# Altium schematic symbol library BARKO_SCHLIB.SchLib: 1064 symbols (part 9 of 11) (continued)
## R-1R-1206_1 (continued)
RES SMD 1 OHM 1% 1/2W 1206; Manufacturer: Stackpole Electronics; Manufacturer Part Number: RNCP1206FTD1R00; Temperature Coefficient: 100ppm/°C; Power Rating: 333mW; .PCBCHK: USED; .Creator: F:TALI; Washability: OK; Stock 1: 171918; Pricing 1: 1=0.1, 10=0.093, 100=0.0358, 1000=0.01575, 2500=0.0136 (USD); Mount: Surface Mount; Case/Package: 1206; Case Code (Metric): 3216; Min Operating Temperature: -55°C; Max Operating Temperature: 155°C; Resistance: 1R; Tolerance: 1%; Packaging: Tape and Reel; Composition: Thin Film; Number of Terminations: 2; Features: Anti-Sulfur,Moisture Resistant; Length: 0.122inch; Height: 0.024inch; Width: 0.059inch; Lead Free: Lead Free; Package Quantity: 1; ComponentLink1URL: http://www1.futureelectronics.com/doc/ROHM%20SEMICONDUCTOR/ESR10EZPD.pdf; ComponentLink1Description: http://www1.futureelectronics.com/doc/ROHM%20SEMICONDUCTOR/ESR10EZPD.pdf; ComponentLink2URL: http://www.rohm.com/web/global/datasheet/ESR01MZPF/esr-e; ComponentLink2Description: http://www.rohm.com/web/global/datasheet/ESR01MZPF/esr-e; ComponentLink3URL: https://www.rohm.com/datasheet/ESR01MZPF/esr-e; ComponentLink3Description: https://www.rohm.com/datasheet/ESR01MZPF/esr-e; Stock 2: 9791; Pricing 2: 1=0.16, 10=0.133, 100=0.052, 1000=0.02178, 2500=0.01996 (USD); .SCHCHK: USED; Supplier 1: Digi-Key; Supplier Part Number 1: RNCP1206FTD1R00DKR-ND
footprint R-1206
pins: 1, 2

## R-2K2-0402
designator R?, comment 2K2  Case/Package: 0402
RES 2.2K OHM 5% 1/16W 0402; Manufacturer: Stackpole Electronics; Manufacturer Part Number: RMCF0402JT2K20; Resistance: 2.2kR; Power Rating: 63mW; Temperature Coefficient: 100ppm/°C; Working Voltage: 50V; .Creator: F:TALI; .PCBCHK: USED; Washability: OK; Supplier 1: Digi-Key; Supplier Part Number 1: RMCF0402JT2K20DKR-ND; Stock 1: 360431; Pricing 1: 1=0.1, 10=0.012, 100=0.005, 1000=0.00224, 2500=0.00195, 5000=0.00161 (USD); Mount: Surface Mount; Case Code (Metric): 1005; Contact Plating: Matte,Tin; Min Operating Temperature: -55°C; Max Operating Temperature: 155°C; Packaging: Tape and Reel; Tolerance: 5%; Composition: Thick Film; Number of Terminations: 2; Max Power Dissipation: 63mW; Features: Automotive AEC-Q200; Length: 0.039inch; Height: 0.016inch; Width: 0.02inch; Radiation Hardening: No; Lead Free: Lead Free; ComponentLink1URL: http://www.seielect.com/Catalog/SEI-RMCF_RMCP.pdf?src-supplier=Future+Electronics; ComponentLink1Description: http://www.seielect.com/Catalog/SEI-RMCF_RMCP.pdf?src-supplier=Future+Electronics; Case Code (Imperial): 0402; .SCHCHK: USED
footprint R-0402
pins: 1, 2

## R-2K2-0402-1
designator R?, comment 2K2  Case/Package: 0402
RES SMD 2.2K OHM 1% 1/16W 0402; Manufacturer: Yageo; Manufacturer Part Number: RC0402FR-072K2L; Resistance: 2.2kR; Power Rating: 63mW; Voltage Rating: 50V; Temperature Coefficient: 100ppm/°C; .Creator: F:TALI; .PCBCHK: USED; Washability: OK; Supplier 1: Digi-Key; Stock 1: 14832343; Pricing 1: 1 = 0.10000, 10 = 0.01600, 100 = 0.00670, 1000 = 0.00301, 2500 = 0.00261, 5000 = 0.00215 (USD); RoHS: Yes; Weight: 2.3E-05oz; Case Code (Imperial): 0402; Case Code (Metric): 1005; Min Operating Temperature: -55°C; Max Operating Temperature: 155°C; Packaging: Tape and Reel; Tolerance: 1%; Composition: Thick Film; Military Standard: Not; Termination: SMD/SMT; Length: 1mm; Height: 0.35mm; Width: 0.5mm; Depth: 0.5mm; Lead Free: Lead Free; REACH SVHC: Unknown; ComponentLink1URL: http://documents.rs-components.com/techlib://itc_doclist_GB.htm?stockno=6186532&src-supplier=RSComponents; ComponentLink1Description: http://documents.rs-components.com/techlib://itc_doclist_GB.htm?stockno=6186532&src-supplier=RSComponents; ComponentLink2URL: http://www.yageo.com/documents/recent/PYu-RC_Group_51_RoHS_L_9.pdf?src-supplier=Mouser; ComponentLink2Description: http://www.yageo.com/documents/recent/PYu-RC_Group_51_RoHS_L_9.pdf?src-supplier=Mouser; ComponentLink3URL: http://www.yageo.com/documents/recent/PYu-RC0402_51_RoHS_L_6_r.pdf?src-supplier=Future+Electronics; ComponentLink3Description: http://www.yageo.com/documents/recent/PYu-RC0402_51_RoHS_L_6_r.pdf?src-supplier=Future+Electronics; ComponentLink4URL: http://www.farnell.com/datasheets/1018594.pdf?src-supplier=Element14; ComponentLink4Description: http://www.farnell.com/datasheets/1018594.pdf?src-supplier=Element14; ComponentLink5URL: http://www.farnell.com/datasheets/2167052.pdf?src-supplier=Element14; ComponentLink5Description: http://www.farnell.com/datasheets/2167052.pdf?src-supplier=Element14; Supplier Part Number 1: 311-2.20KLRCT-ND; .SCHCHK: USED
footprint R-0402
pins: 1, 2

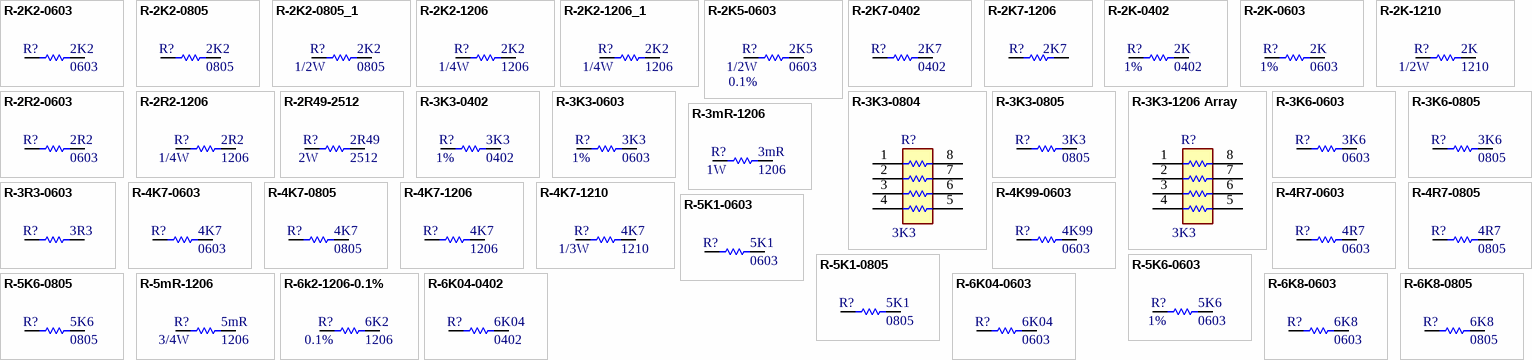
[diagram p36: symbols R-2K2-0603 to R-6K8-0805]

## R-2K2-0603
designator R?, comment 2K2  Case/Package: 0603
RES SMD 2.2K OHM 5% 1/10W 0603; Manufacturer: Yageo; Manufacturer Part Number: RC0603JR-072K2P; Resistance: 2.2kR; Max Power Dissipation: 100mW; Temperature Coefficient: 150ppm/°C; Voltage Rating (DC): 50V; .PCBCHK: USED; .Creator: F:TALI; Washability: OK; Stock 1: 2807; Pricing 1: 1=0.1, 10=0.044, 100=0.0178, 1000=0.00798, 2500=0.00693 (USD); Case Code (Metric): 1608; Case Code (Imperial): 0603; Min Operating Temperature: -55°C; Max Operating Temperature: 155°C; Packaging: Tape and Reel; Composition: Thick Film; Number of Terminations: 2; Tolerance: 5%; Features: Moisture Resistant; Length: 0.063inch; Height: 0.022inch; Width: 0.031inch; Stock 2: 2314804; Pricing 2: 1=0.1, 10=0.022, 100=0.0088, 1000=0.00396, 2500=0.00344 (USD); Number of Pins: 2; Power Rating: 100mW; Voltage Rating: 50V; Termination: SMD/SMT; Military Standard: Not; Depth: 0.8mm; REACH SVHC: Unknown; Lead Free: Lead Free; Stock 3: 4100; Pricing 3: 1=0.39, 10=0.332, 100=0.1298, 1000=0.05435, 2500=0.04982 (USD); Mount: Surface Mount; Contact Plating: Lead,Tin; Stock 4: 4265000; Pricing 4: 5000=0.00312, 10000=0.00271, 25000=0.00238, 50000=0.00219, 125000=0.00214 (USD); Package Quantity: 1; ComponentLink1URL: http://www.farnell.com/datasheets/1868787.pdf; ComponentLink1Description: http://www.farnell.com/datasheets/1868787.pdf; ComponentLink2URL: http://www.farnell.com/datasheets/2167052.pdf; ComponentLink2Description: http://www.farnell.com/datasheets/2167052.pdf; ComponentLink3URL: http://www.yageo.com/documents/recent/PYu-RC_Group_51_RoHS_L_9.pdf; ComponentLink3Description: http://www.yageo.com/documents/recent/PYu-RC_Group_51_RoHS_L_9.pdf; ComponentLink4URL: http://www.farnell.com/datasheets/443971.pdf; ComponentLink4Description: http://www.farnell.com/datasheets/443971.pdf; .SCHCHK: USED; Supplier 1: Digi-Key; Supplier Part Number 1: YAG1313DKR-ND
footprint R-0603
pins: 1, 2

## R-2K2-0805
designator R?, comment 2K2  Case Code (Imperial): 0805
RES SMD 2.2K OHM 5% 1/8W 0805; Manufacturer: Stackpole Electronics; Manufacturer Part Number: RMCF0805JT2K20; Resistance: 2.2kR; Power Rating: 125mW; Temperature Coefficient: 100ppm/°C; Voltage Rating (DC): 150V; .PCBCHK: USED; .Creator: F:TALI; Washability: OK; Stock 1: 352492; Pricing 1: 1=0.1, 10=0.021, 100=0.0086, 1000=0.00385, 2500=0.00334 (USD); Mount: Surface Mount; Case/Package: 0805; Case Code (Metric): 2012; Contact Plating: Matte,Tin; Min Operating Temperature: -55°C; Max Operating Temperature: 155°C; Tolerance: 5%; Packaging: Tape and Reel; Composition: Thick Film; Number of Terminations: 2; Military Standard: Not; Max Power Dissipation: 125mW; Features: Automotive AEC-Q200; Length: 2mm; Height: 0.026inch; Width: 0.049inch; Depth: 1.25mm; Radiation Hardening: No; Lead Free: Lead Free; ComponentLink1URL: https://www.verical.com/server-webapp/html/getDatasheet?partID=366464; ComponentLink1Description: https://www.verical.com/server-webapp/html/getDatasheet?partID=366464; Stock 2: 5318281; Pricing 2: 1=0.1, 10=0.046, 100=0.0186, 1000=0.00835, 2500=0.00725 (USD); Number of Pins: 2; Package Quantity: 1; Voltage Rating: 150V; Termination: SMD/SMT; Lead Pitch: 0.4mm; REACH SVHC: Unknown; ComponentLink2URL: http://www.farnell.com/datasheets/38627.pdf; ComponentLink2Description: http://www.farnell.com/datasheets/38627.pdf; ComponentLink3URL: http://www.farnell.com/datasheets/444164.pdf; ComponentLink3Description: http://www.farnell.com/datasheets/444164.pdf; ComponentLink4URL: http://www.yageo.com/documents/recent/PYu-RC_Group_51_RoHS_L_9.pdf; ComponentLink4Description: http://www.yageo.com/documents/recent/PYu-RC_Group_51_RoHS_L_9.pdf; Stock 3: 12445; Pricing 3: 1=0.1, 10=0.068, 100=0.0278, 1000=0.01251, 2500=0.01085 (USD); Thickness: 508um; ComponentLink5URL: http://www.bourns.com/data/global/pdfs/CHPREZTR.pdf; ComponentLink5Description: http://www.bourns.com/data/global/pdfs/CHPREZTR.pdf; ComponentLink6URL: http://www.bourns.com/docs/Product-Datasheets/CHPREZTR.pdf; ComponentLink6Description: http://www.bourns.com/docs/Product-Datasheets/CHPREZTR.pdf; ComponentLink7URL: https://www.bourns.com/docs/Product-Datasheets/CHPREZTR.pdf; ComponentLink7Description: https://www.bourns.com/docs/Product-Datasheets/CHPREZTR.pdf; .SCHCHK: USED; Supplier 1: Digi-Key; Supplier Part Number 1: RMCF0805JT2K20DKR-ND
footprint R-0805
pins: 1, 2

## R-2K2-0805_1
designator R?, comment 2K2  Power Rating: 1/2W  Case Code (Imperial): 0805
RES SMD 2.2K OHM 5% 1/2W 0805; Manufacturer: Vishay Dale; Manufacturer Part Number: CRCW08052K20JNEAHP; Resistance: 2.2kR; Voltage Rating: 150V; Max Power Dissipation: 333mW; Temperature Coefficient: 200ppm/°C; .Creator: F:TALI; .PCBCHK: USED; Washability: OK; Supplier 1: Digi-Key; Stock 1: 18079; Pricing 1: 1=0.25, 10=0.213, 100=0.0832, 1000=0.03485, 2500=0.03194 (USD); Case/Package: 0805; Weight: 0.000194oz; Case Code (Metric): 2012; Contact Plating: Tin; Min Operating Temperature: -55°C; Max Operating Temperature: 155°C; Package Quantity: 1; Tolerance: 5%; Packaging: Tape and Reel; Composition: Thick Film; Number of Terminations: 2; Termination: SMD/SMT; Features: Automotive AEC-Q200; Length: 0.079inch; Height: 0.024inch; Width: 0.049inch; Radiation Hardening: No; Lead Free: Lead Free; ComponentLink1URL: http://www.vishay.com/docs/20043/crcwhpe3.pdf; ComponentLink1Description: http://www.vishay.com/docs/20043/crcwhpe3.pdf; ComponentLink2URL: http://www.mouser.com/ds/2/427/crcwhpe3-46056.pdf; ComponentLink2Description: http://www.mouser.com/ds/2/427/crcwhpe3-46056.pdf; Supplier Part Number 1: 541-2.2KTADKR-ND; .SCHCHK: USED
pins: 1, 2

## R-2K2-1206
designator R?, comment 2K2  Max Power Dissipation: 1/4W  Case Code (Imperial): 1206
RES SMD 2.2K OHM 5% 1/4W 1206; Manufacturer: Yageo; Manufacturer Part Number: RC1206JR-072K2L; Power Rating: 250mW; Resistance: 2.2kR; Voltage Rating: 200V; Temperature Coefficient: 100ppm/°C; .PCBCHK: USED; .Creator: F:TALI; Washability: OK; Stock 1: 16821; Pricing 1: 1=0.1, 10=0.07, 100=0.0284, 1000=0.01274, 2500=0.01106 (USD); Case/Package: 1206; Weight: 0.000571oz; Case Code (Metric): 3216; Min Operating Temperature: -55°C; Max Operating Temperature: 155°C; Composition: Thick Film; Tolerance: 5%; Packaging: Tape and Reel; Termination: SMD/SMT; Military Standard: Not; Length: 3.2mm; Height: 0.55mm; Width: 1.6mm; Depth: 1.6mm; REACH SVHC: Unknown; Lead Free: Lead Free; ComponentLink1URL: http://www.yageo.com.tw/exep/pages/download/literatures/PYu-R_INT-thick_7.pdf; ComponentLink1Description: http://www.yageo.com.tw/exep/pages/download/literatures/PYu-R_INT-thick_7.pdf; ComponentLink2URL: http://www.farnell.com/datasheets/444357.pdf; ComponentLink2Description: http://www.farnell.com/datasheets/444357.pdf; ComponentLink3URL: http://www.yageo.com/documents/recent/PYu-RC1206_51_RoHS_L-4.pdf; ComponentLink3Description: http://www.yageo.com/documents/recent/PYu-RC1206_51_RoHS_L-4.pdf; ComponentLink4URL: https://produktinfo.conrad.com/datenblaetter/400000-424999/402583-da-01-en-SMD_Widerstand_Chip1206_2_2_kOhm.pdf; ComponentLink4Description: https://produktinfo.conrad.com/datenblaetter/400000-424999/402583-da-01-en-SMD_Widerstand_Chip1206_2_2_kOhm.pdf; Stock 2: 332466; Pricing 2: 1=0.1, 10=0.074, 100=0.0301, 1000=0.01351, 2500=0.01172 (USD); Mount: Surface Mount; Contact Plating: Tin; Package Quantity: 1; Number of Terminations: 2; Voltage Rating (DC): 200V; Features: Automotive AEC-Q200; Radiation Hardening: No; ComponentLink5URL: http://industrial.panasonic.com/www-data/pdf/AOA0000/AOA0000CE1.pdf; ComponentLink5Description: http://industrial.panasonic.com/www-data/pdf/AOA0000/AOA0000CE1.pdf; ComponentLink6URL: http://www.farnell.com/datasheets/1500035.pdf; ComponentLink6Description: http://www.farnell.com/datasheets/1500035.pdf; ComponentLink7URL: https://www.alliedelec.com/m/d/51cd0790071e1666bdb9d00c57fcf960.pdf; ComponentLink7Description: https://www.alliedelec.com/m/d/51cd0790071e1666bdb9d00c57fcf960.pdf; ComponentLink8URL: http://www.farnell.com/datasheets/1678796.pdf; ComponentLink8Description: http://www.farnell.com/datasheets/1678796.pdf; ComponentLink9URL: http://www.farnell.com/datasheets/2059623.pdf; ComponentLink9Description: http://www.farnell.com/datasheets/2059623.pdf; Stock 3: 58559; Pricing 3: 1=0.1, 10=0.065, 100=0.0265, 1000=0.0119, 2500=0.01033 (USD); .SCHCHK: USED; Supplier 1: Digi-Key; Supplier Part Number 1: 311-2.2KERDKR-ND
footprint R-1206
pins: 1, 2

## R-2K2-1206_1
designator R?, comment 2K2  Max Power Dissipation: 1/4W  Case Code (Imperial): 1206
RES SMD 2K2 1/4W 5% 1206; Manufacturer: Bourns; Manufacturer Part Number: CR1206-FX-2201ELF; Resistance: 2.2kR; Tolerance: 1%; Temperature Coefficient: 100ppm/°C; Voltage Rating (DC): 200V; Power Rating: 250mW; .PCBCHK: USED; .Creator: F:TALI; Washability: OK; Number of Circuits: 1; Slew Rate: 2V/µs; -3db Bandwidth: 400kHz; Input Bias Current: 90uA; Input Offset Voltage (Vos): 5uV; Operating Supply Current: 1.8mA; Stock 1: 20978; Pricing 1: 1=0.1, 10=0.042, 100=0.0171, 1000=0.0077, 2500=0.00668 (USD); Mount: Surface Mount; Case/Package: 1206; Number of Pins: 2; Case Code (Metric): 3216; Contact Plating: Tin; Min Operating Temperature: -55°C; Max Operating Temperature: 155°C; Packaging: Tape and Reel; Composition: Thick Film; Number of Terminations: 2; Package Quantity: 5000; Military Standard: Not; Voltage Rating: 200V; Termination: SMD/SMT; Length: 3.2mm; Height: 0.6mm; Width: 1.6mm; Depth: 1.6mm; Thickness: 610um; Radiation Hardening: No; REACH SVHC: No SVHC; ComponentLink1URL: http://www.farnell.com/datasheets/2016309.pdf; ComponentLink1Description: http://www.farnell.com/datasheets/2016309.pdf; ComponentLink2URL: http://uk.rs-online.com/webdocs/0fcd/0900766b80fcdb72.pdf; ComponentLink2Description: http://uk.rs-online.com/webdocs/0fcd/0900766b80fcdb72.pdf; ComponentLink3URL: http://www.bourns.com/pdfs/chpreztr.pdf; ComponentLink3Description: http://www.bourns.com/pdfs/chpreztr.pdf; ComponentLink4URL: https://www.alliedelec.com/m/d/8318635a9e5af6f7dacb272be3e73d2e.pdf; ComponentLink4Description: https://www.alliedelec.com/m/d/8318635a9e5af6f7dacb272be3e73d2e.pdf; Weight: 0.000353oz; Features: Automotive AEC-Q200; Lead Free: Lead Free; ComponentLink5URL: https://www.distrelec.biz/Web/Downloads/a_/en/flD-CRCW-e3_data_en.pdf?mime=application%2Fpdf; ComponentLink5Description: https://www.distrelec.biz/Web/Downloads/a_/en/flD-CRCW-e3_data_en.pdf?mime=application%2Fpdf; ComponentLink6URL: http://www.vishay.com/docs/20035/dcrcwe3.pdf; ComponentLink6Description: http://www.vishay.com/docs/20035/dcrcwe3.pdf; ComponentLink7URL: http://www.farnell.com/datasheets/2046716.pdf; ComponentLink7Description: http://www.farnell.com/datasheets/2046716.pdf; ComponentLink8URL: https://www.alliedelec.com/m/d/0c934d6939ccefa68dbe0b96d821c8cf.pdf; ComponentLink8Description: https://www.alliedelec.com/m/d/0c934d6939ccefa68dbe0b96d821c8cf.pdf; ComponentLink9URL: http://www.vishay.com/docs/20008/dcrcw.pdf; ComponentLink9Description: http://www.vishay.com/docs/20008/dcrcw.pdf; ComponentLink10URL: https://www.verical.com/server-webapp/html/getDatasheet?partID=250918; ComponentLink10Description: https://www.verical.com/server-webapp/html/getDatasheet?partID=250918; ComponentLink11URL: http://uk.rs-online.com/webdocs/13ec/0900766b813ecc07.pdf; ComponentLink11Description: http://uk.rs-online.com/webdocs/13ec/0900766b813ecc07.pdf; Stock 2: 3711; Pricing 2: 1=0.17, 10=0.146, 100=0.0572, 1000=0.02396, 2500=0.02196 (USD); ComponentLink12URL: http://www.rohm.com/web/global/datasheet/ESR01MZPF/esr-e; ComponentLink12Description: http://www.rohm.com/web/global/datasheet/ESR01MZPF/esr-e; ComponentLink13URL: https://www.rohm.com/datasheet/ESR01MZPF/esr-e; ComponentLink13Description: https://www.rohm.com/datasheet/ESR01MZPF/esr-e; .SCHCHK: USED; Supplier 1: Digi-Key; Supplier Part Number 1: RHM2.2KICT-ND; Stock: 8804; Pricing: 1=2.78, 10=2.499, 25=2.3624, 100=1.9425, 250=1.743, 500=1.68, 1000=1.3965 (USD); RoHS: No; ComponentLink14URL: http://www.ti.com/general/docs/lit/getliterature.tsp?genericPartNumber=INA240&fileType=pdf&src-supplier=Farnell; ComponentLink14Description: http://www.ti.com/general/docs/lit/getliterature.tsp?genericPartNumber=INA240&fileType=pdf&src-supplier=Farnell; ComponentLink15URL: http://www.ti.com/lit/ds/symlink/ina240.pdf?src-supplier=Digi-Key; ComponentLink15Description: http://www.ti.com/lit/ds/symlink/ina240.pdf?src-supplier=Digi-Key
footprint R-1206
pins: 1, 2

## R-2K5-0603
designator R?, comment 2K5  Tolerance: 0.1%  Max Power Dissipation: 1/2W  Case Code (Imperial): 0603
RES SMD 2.5K OHM 0.1% 1/2W 0603; Manufacturer: Vishay Dale Thin Film; Manufacturer Part Number: PCAN0603E2501BST5; Resistance: 2.5kR; Temperature Coefficient: 25ppm/°C; .PCBCHK: USED; .Creator: F:TALI; Washability: OK; Supplier 1: Digi-Key; Supplier Part Number 1: 764-1254-6-ND; Stock 1: 8000; Pricing 1: 1=1.37, 10=1.217, 100=0.8836 (USD); Case/Package: 0603; Case Code (Metric): 1608; Min Operating Temperature: -55°C; Max Operating Temperature: 155°C; Packaging: Tape and Reel; Composition: Thin Film; Number of Terminations: 2; Features: Moisture Resistant; Length: 0.064inch; Height: 0.018inch; Width: 0.032inch; .SCHCHK: USED
footprint R-0603
pins: 1, 2

## R-2K7-0402
designator R?, comment 2K7  Case Code (Imperial): 0402
RES SMD 2.7K OHM 1% 1/10W 0402; Manufacturer: Panasonic; Manufacturer Part Number: ERJ-2RKF2701X; Resistance: 2.7kR; Temperature Coefficient: 100ppm/°C; Power Rating: 100mW; Voltage Rating: 50V; .PCBCHK: USED; .Creator: F:TALI; Washability: OK; Stock 1: 971110; Pricing 1: 1=0.1, 10=0.056, 100=0.0227, 1000=0.01018, 2500=0.00884, 5000=0.0073 (USD); Mount: Surface Mount; Case/Package: 0402; Number of Pins: 2; Contact Plating: Tin; Case Code (Metric): 1005; Min Operating Temperature: -55°C; Max Operating Temperature: 155°C; Tolerance: 1%; Composition: Thick Film; Packaging: Tape and Reel; Package Quantity: 1; Number of Terminations: 2; Termination: SMD/SMT; Military Standard: Not; Max Power Dissipation: 100mW; Voltage Rating (DC): 50V; Features: Automotive AEC-Q200; Length: 1mm; Height: 0.35mm; Width: 0.02inch; Depth: 0.5mm; Radiation Hardening: No; REACH SVHC: No SVHC; Lead Free: Lead Free; ComponentLink1URL: http://www.farnell.com/datasheets/1678782.pdf; ComponentLink1Description: http://www.farnell.com/datasheets/1678782.pdf; ComponentLink2URL: https://industrial.panasonic.com/cdbs/www-data/pdf/RDA0000/DMA0000COL11.pdf; ComponentLink2Description: https://industrial.panasonic.com/cdbs/www-data/pdf/RDA0000/DMA0000COL11.pdf; ComponentLink3URL: http://industrial.panasonic.com/www-data/pdf/AOA0000/AOA0000CE2.pdf; ComponentLink3Description: http://industrial.panasonic.com/www-data/pdf/AOA0000/AOA0000CE2.pdf; ComponentLink4URL: http://www.farnell.com/datasheets/1911175.pdf; ComponentLink4Description: http://www.farnell.com/datasheets/1911175.pdf; Stock 2: 1854196; Pricing 2: 1=0.1, 10=0.031, 100=0.0125, 1000=0.0056, 2500=0.00486, 5000=0.00401 (USD); ComponentLink5URL: http://www.mouser.com/ds/2/315/AOA0000C84-947596.pdf; ComponentLink5Description: http://www.mouser.com/ds/2/315/AOA0000C84-947596.pdf; ComponentLink6URL: http://industrial.panasonic.com/www-data/pdf/AOA0000/AOA0000CE1.pdf; ComponentLink6Description: http://industrial.panasonic.com/www-data/pdf/AOA0000/AOA0000CE1.pdf; ComponentLink7URL: https://www.alliedelec.com/m/d/51cd0790071e1666bdb9d00c57fcf960.pdf; ComponentLink7Description: https://www.alliedelec.com/m/d/51cd0790071e1666bdb9d00c57fcf960.pdf; ComponentLink8URL: http://www.farnell.com/datasheets/1678796.pdf; ComponentLink8Description: http://www.farnell.com/datasheets/1678796.pdf; ComponentLink9URL: http://www.farnell.com/datasheets/1500035.pdf; ComponentLink9Description: http://www.farnell.com/datasheets/1500035.pdf; ComponentLink10URL: http://www.farnell.com/datasheets/2059623.pdf; ComponentLink10Description: http://www.farnell.com/datasheets/2059623.pdf; Stock 3: 971110; Pricing 3: 1=0.1, 10=0.056, 100=0.0227, 1000=0.01018, 2500=0.00884, 5000=0.0073 (USD); .SCHCHK: USED; Supplier 1: Digi-Key; Supplier Part Number 1: P2.70KLDKR-ND
footprint R-0402
pins: 1, 2

## R-2K7-1206
designator R?, comment 2K7
RES 2.7K OHM 1% 1/2W 1206; Manufacturer 1: Stackpole Electronics; Manufacturer Part Number 1: RNCP1206FTD2K70; Washability: OK; .Creator: M.OZKAN; .PCBCHK: USED; Supplier 1: Avnet; Stock 1: 0; RoHS: No; Mount: Surface Mount; Min Operating Temperature: -55°C; Max Operating Temperature: 155°C; Tolerance: 1%; Supplier Part Number 1: RNCP1206FTD2K70; .SCHCHK: USED
footprint R-1206
pins: 1, 2

## R-2K-0402
designator R?, comment 2K  Tolerance: 1%  Case/Package: 0402
RES SMD 2K OHM 5% 1/10W 0402; Manufacturer: Panasonic; Manufacturer Part Number: ERJ2RKF2001X; .PCBCHK: USED; .Creator: F:TALI; Resistance: 2kR; Power Rating: 100mW; Voltage Rating: 50V; Temperature Coefficient: 100ppm/°C; Washability: OK; ComponentLink1URL: http://www.farnell.com/datasheets/1678782.pdf; ComponentLink1Description: http://www.farnell.com/datasheets/1678782.pdf; ComponentLink2URL: https://industrial.panasonic.com/cdbs/www-data/pdf/RDA0000/DMA0000COL11.pdf; ComponentLink2Description: https://industrial.panasonic.com/cdbs/www-data/pdf/RDA0000/DMA0000COL11.pdf; ComponentLink3URL: https://industrial.panasonic.com/cdbs/www-data/pdf/RDA0000/AOA0000C304.pdf; ComponentLink3Description: https://industrial.panasonic.com/cdbs/www-data/pdf/RDA0000/AOA0000C304.pdf; ComponentLink4URL: http://www.farnell.com/datasheets/1911175.pdf; ComponentLink4Description: http://www.farnell.com/datasheets/1911175.pdf; ComponentLink5URL: http://www.farnell.com/datasheets/426256.pdf; ComponentLink5Description: http://www.farnell.com/datasheets/426256.pdf; ComponentLink6URL: http://www.mouser.com/ds/2/315/AOA0000CE2-37512.pdf; ComponentLink6Description: http://www.mouser.com/ds/2/315/AOA0000CE2-37512.pdf; ComponentLink7URL: http://www.alliedelec.com/m/d/623f45ff1957d936ff56d46fd1c28cac.pdf; ComponentLink7Description: http://www.alliedelec.com/m/d/623f45ff1957d936ff56d46fd1c28cac.pdf; ComponentLink8URL: http://industrial.panasonic.com/www-data/pdf/AOA0000/AOA0000CE2.pdf; ComponentLink8Description: http://industrial.panasonic.com/www-data/pdf/AOA0000/AOA0000CE2.pdf; ComponentLink9URL: http://www.bourns.com/docs/Product-Datasheets/CR0402.pdf; ComponentLink9Description: http://www.bourns.com/docs/Product-Datasheets/CR0402.pdf; ComponentLink10URL: https://www.bourns.com/docs/Product-Datasheets/CR0402.pdf; ComponentLink10Description: https://www.bourns.com/docs/Product-Datasheets/CR0402.pdf; ComponentLink11URL: http://www.mouser.com/ds/2/315/AOA0000C84-947596.pdf; ComponentLink11Description: http://www.mouser.com/ds/2/315/AOA0000C84-947596.pdf; ComponentLink12URL: https://www.alliedelec.com/m/d/51cd0790071e1666bdb9d00c57fcf960.pdf; ComponentLink12Description: https://www.alliedelec.com/m/d/51cd0790071e1666bdb9d00c57fcf960.pdf; ComponentLink13URL: http://www.farnell.com/datasheets/1500035.pdf; ComponentLink13Description: http://www.farnell.com/datasheets/1500035.pdf; ComponentLink14URL: http://www.farnell.com/datasheets/1678796.pdf; ComponentLink14Description: http://www.farnell.com/datasheets/1678796.pdf; ComponentLink15URL: http://www.jameco.com/Jameco/Products/ProdDS/1986861.pdf; ComponentLink15Description: http://www.jameco.com/Jameco/Products/ProdDS/1986861.pdf; ComponentLink16URL: http://industrial.panasonic.com/www-data/pdf/AOA0000/AOA0000CE1.pdf; ComponentLink16Description: http://industrial.panasonic.com/www-data/pdf/AOA0000/AOA0000CE1.pdf; ComponentLink17URL: http://www.farnell.com/datasheets/2059623.pdf; ComponentLink17Description: http://www.farnell.com/datasheets/2059623.pdf; .SCHCHK: USED; Supplier 1: Digi-Key; Stock 1: 3154839; Pricing 1: 1=0.10000, 10=0.04500, 100=0.01830, 1000=0.00823, 2500=0.00715, 5000=0.00590 (USD); RoHS: Yes; Mount: Surface Mount; Case Code (Metric): 1005; Case Code (Imperial): 0402; Contact Plating: Tin; Min Operating Temperature: -55°C; Max Operating Temperature: 155°C; Packaging: Tape and Reel; Package Quantity: 10000; Composition: Thick Film; Number of Terminations: 2; Termination: SMD/SMT; Military Standard: Not; Max Power Dissipation: 100mW; Voltage Rating (DC): 50V; Working Voltage: 50V; Features: Automotive AEC-Q200; Length: 1mm; Height: 0.35mm; Width: 0.02inch; Depth: 0.5mm; Radiation Hardening: No; REACH SVHC: No SVHC; Lead Free: Lead Free; ComponentLink18URL: https://datasheet.ciiva.com/11821/0900766b80f80784-11821275.pdf?src-supplier=RSComponents; ComponentLink18Description: https://datasheet.ciiva.com/11821/0900766b80f80784-11821275.pdf?src-supplier=RSComponents; ComponentLink19URL: https://datasheet.ciiva.com/28673/1678782-28673989.pdf?src-supplier=Element14; ComponentLink19Description: https://datasheet.ciiva.com/28673/1678782-28673989.pdf?src-supplier=Element14; ComponentLink20URL: https://datasheet.ciiva.com/48531/aoa0000ce2-48531062.pdf?src-supplier=Avnet; ComponentLink20Description: https://datasheet.ciiva.com/48531/aoa0000ce2-48531062.pdf?src-supplier=Avnet; ComponentLink21URL: https://datasheet.ciiva.com/16199/aoa0000ce2-16199479.pdf?src-supplier=Future+Electronics; ComponentLink21Description: https://datasheet.ciiva.com/16199/aoa0000ce2-16199479.pdf?src-supplier=Future+Electronics; ComponentLink22URL: https://datasheet.ciiva.com/43460/426256-43460297.pdf?src-supplier=Farnell; ComponentLink22Description: https://datasheet.ciiva.com/43460/426256-43460297.pdf?src-supplier=Farnell; ComponentLink23URL: https://datasheet.ciiva.com/46377/426256-46377369.pdf?src-supplier=Element14; ComponentLink23Description: https://datasheet.ciiva.com/46377/426256-46377369.pdf?src-supplier=Element14; ComponentLink24URL: https://datasheet.ciiva.com/16514/aoa0000ce2-16514266.pdf?src-supplier=Avnet+Asia; ComponentLink24Description: https://datasheet.ciiva.com/16514/aoa0000ce2-16514266.pdf?src-supplier=Avnet+Asia; ComponentLink25URL: https://datasheet.ciiva.com/16785/70260748-16785818.pdf?src-supplier=Allied+Electronics; ComponentLink25Description: https://datasheet.ciiva.com/16785/70260748-16785818.pdf?src-supplier=Allied+Electronics; ComponentLink26URL: https://datasheet.ciiva.com/24070/aoa0000ce2-24070698.pdf?src-supplier=Mouser; ComponentLink26Description: https://datasheet.ciiva.com/24070/aoa0000ce2-24070698.pdf?src-supplier=Mouser; Supplier Part Number 1: P2.00KLCT-ND
footprint R-0402
pins: 1, 2

## R-2K-0603
designator R?, comment 2K  Tolerance: 1%  Case/Package: 0603
RES 2K OHM 1% 1/10W 0603; Manufacturer: Stackpole Electronics; Manufacturer Part Number: RMCF0603FT2K00; Resistance: 2kR; Power Rating: 100mW; Temperature Coefficient: 100ppm/°C; Working Voltage: 75V; Washability: OK; .Creator: M.OZKAN; .PCBCHK: USED; Supplier 1: Digi-Key; Stock 1: 235844; Pricing 1: 1=0.10000, 10=0.01700, 100=0.00680, 1000=0.00306, 2500=0.00266 (USD); RoHS: Yes; Mount: Surface Mount; Case Code (Metric): 1608; Case Code (Imperial): 0603; Contact Plating: Tin; Min Operating Temperature: -55°C; Max Operating Temperature: 155°C; Packaging: Tape and Reel; Composition: Thick Film; Number of Terminations: 2; Military Standard: Not; Max Power Dissipation: 100mW; Features: Automotive AEC-Q200; Length: 1.55mm; Height: 0.022inch; Width: 0.031inch; Depth: 0.8mm; Radiation Hardening: No; Lead Free: Lead Free; ComponentLink1URL: https://datasheet.ciiva.com/15193/getdatasheetpartid-362041-15193463.pdf?src-supplier=Verical; ComponentLink1Description: https://datasheet.ciiva.com/15193/getdatasheetpartid-362041-15193463.pdf?src-supplier=Verical; Supplier Part Number 1: RMCF0603FT2K00CT-ND; Supplier 2: Digi-Key; Supplier Part Number 2: 311-2.00KHRCT-ND; .SCHCHK: USED
footprint R-0603
pins: 1, 2

## R-2K-1210
designator R?, comment 2K  Power Rating: 1/2W  Case Code (Imperial): 1210
RES SMD 2K 1/2W 5% 1210; Manufacturer: Panasonic; Manufacturer Part Number: ERJ-14YJ202U; Resistance: 2kR; Temperature Coefficient: 200ppm/°C; Voltage Rating: 200V; Max Power Dissipation: 500mW; .PCBCHK: USED; .Creator: F:TALI; Washability: OK; Stock 1: 5267; Pricing 1: 1=0.17, 10=0.141, 100=0.0551, 1000=0.02305, 2500=0.02112 (USD); Mount: Surface Mount; Case/Package: 1210; Contact Plating: Tin; Case Code (Metric): 3225; Min Operating Temperature: -55°C; Max Operating Temperature: 155°C; Tolerance: 5%; Composition: Thick Film; Packaging: Tape and Reel; Package Quantity: 1; Number of Terminations: 2; Termination: SMD/SMT; Voltage Rating (DC): 200V; Features: Automotive AEC-Q200; Length: 3.2mm; Height: 0.6mm; Width: 0.098inch; Depth: 2.5mm; Radiation Hardening: No; REACH SVHC: No SVHC; Lead Free: Lead Free; ComponentLink1URL: http://www.farnell.com/datasheets/2059623.pdf; ComponentLink1Description: http://www.farnell.com/datasheets/2059623.pdf; ComponentLink2URL: http://industrial.panasonic.com/www-data/pdf/AOA0000/AOA0000CE1.pdf; ComponentLink2Description: http://industrial.panasonic.com/www-data/pdf/AOA0000/AOA0000CE1.pdf; ComponentLink3URL: http://www.farnell.com/datasheets/1678796.pdf; ComponentLink3Description: http://www.farnell.com/datasheets/1678796.pdf; ComponentLink4URL: https://www.alliedelec.com/m/d/51cd0790071e1666bdb9d00c57fcf960.pdf; ComponentLink4Description: https://www.alliedelec.com/m/d/51cd0790071e1666bdb9d00c57fcf960.pdf; Stock 2: 9000; Pricing 2: 1=0.27, 10=0.226, 100=0.0885, 1000=0.03703, 2500=0.03394 (USD); Number of Pins: 2; Weight: 0.000564oz; Military Standard: Not; Working Voltage: 200V; ComponentLink5URL: http://www.vishay.com/docs/20035/dcrcwe3.pdf; ComponentLink5Description: http://www.vishay.com/docs/20035/dcrcwe3.pdf; ComponentLink6URL: http://www.farnell.com/datasheets/2046716.pdf; ComponentLink6Description: http://www.farnell.com/datasheets/2046716.pdf; Stock 3: 16725; Pricing 3: 1=0.26, 10=0.22, 100=0.0861, 1000=0.03602, 2500=0.03302 (USD); ComponentLink7URL: https://www.alliedelec.com/m/d/623f45ff1957d936ff56d46fd1c28cac.pdf; ComponentLink7Description: https://www.alliedelec.com/m/d/623f45ff1957d936ff56d46fd1c28cac.pdf; ComponentLink8URL: http://www.farnell.com/datasheets/1678782.pdf; ComponentLink8Description: http://www.farnell.com/datasheets/1678782.pdf; ComponentLink9URL: http://www.mouser.com/ds/2/315/AOA0000CE2-37512.pdf; ComponentLink9Description: http://www.mouser.com/ds/2/315/AOA0000CE2-37512.pdf; ComponentLink10URL: http://industrial.panasonic.com/www-data/pdf/AOA0000/AOA0000CE2.pdf; ComponentLink10Description: http://industrial.panasonic.com/www-data/pdf/AOA0000/AOA0000CE2.pdf; .SCHCHK: USED; Supplier 1: Digi-Key; Supplier Part Number 1: P2.0KVDKR-ND
footprint R-1210
pins: 1, 2

## R-2R2-0603
designator R?, comment 2R2  Case Code (Imperial): 0603
RES SMD 2R2 5% 1/10W 0603; Manufacturer: Panasonic; Manufacturer Part Number: ERJ-3GEYJ2R2V; Resistance: 2.2R; Temperature Coefficient: 600ppm/°C; Power Rating: 100mW; Voltage Rating: 75V; Voltage Rating (DC): 50V; .PCBCHK: USED; .Creator: F:TALI; Washability: OK; Stock 1: 3090766; Pricing 1: 1=0.1, 10=0.052, 100=0.0211, 1000=0.00949, 2500=0.00824 (USD); Mount: Surface Mount; Case Code (Metric): 1608; Contact Plating: Tin; Min Operating Temperature: -55°C; Max Operating Temperature: 155°C; Packaging: Tape and Reel; Tolerance: 5%; Composition: Thick Film; Military Standard: Not; Max Power Dissipation: 100mW; Number of Terminations: 2; Package Quantity: 1; Termination: SMD/SMT; Features: Automotive AEC-Q200; Length: 1.6mm; Height: 0.45mm; Depth: 0.8mm; Width: 0.8mm; Radiation Hardening: No; Lead Free: Lead Free; REACH SVHC: No SVHC; ComponentLink1URL: http://www.farnell.com/datasheets/1500035.pdf; ComponentLink1Description: http://www.farnell.com/datasheets/1500035.pdf; ComponentLink2URL: http://www.mouser.com/ds/2/315/AOA0000C84-947596.pdf; ComponentLink2Description: http://www.mouser.com/ds/2/315/AOA0000C84-947596.pdf; ComponentLink3URL: https://www.alliedelec.com/m/d/51cd0790071e1666bdb9d00c57fcf960.pdf; ComponentLink3Description: https://www.alliedelec.com/m/d/51cd0790071e1666bdb9d00c57fcf960.pdf; ComponentLink4URL: http://industrial.panasonic.com/www-data/pdf/AOA0000/AOA0000CE1.pdf; ComponentLink4Description: http://industrial.panasonic.com/www-data/pdf/AOA0000/AOA0000CE1.pdf; Stock 2: 24880; Pricing 2: 1=0.1, 10=0.042, 100=0.0171, 1000=0.0077, 2500=0.00668 (USD); Thickness: 457um; ComponentLink5URL: http://www.mouser.com/ds/2/54/chpreztr-977002.pdf; ComponentLink5Description: http://www.mouser.com/ds/2/54/chpreztr-977002.pdf; Stock 3: 7300; Pricing 3: 100=0.0144, 1000=0.0064, 5000=0.00455, 15000=0.0039, 50000=0.00325 (USD); Case/Package: 0603; .SCHCHK: USED; Supplier 1: Digi-Key; Supplier Part Number 1: P2.2GDKR-ND
footprint R-0603
pins: 1, 2

## R-2R2-1206
designator R?, comment 2R2  Max Power Dissipation: 1/4W  Case Code (Imperial): 1206
RES SMD 2.2 OHM 1% 1/4W 1206; Manufacturer: Stackpole Electronics; Manufacturer Part Number: RMCF1206JT2R20; Resistance: 2.2R; Power Rating: 250mW; Tolerance: 5%; Temperature Coefficient: 200ppm/°C; Voltage Rating (DC): 200V; .PCBCHK: USED; .Creator: F:TALI; Washability: OK; Stock 1: 13533; Pricing 1: 1=0.1, 10=0.035, 100=0.0143, 1000=0.00641, 2500=0.00557 (USD); Mount: Surface Mount; Case/Package: 1206; Case Code (Metric): 3216; Contact Plating: Matte,Tin; Min Operating Temperature: -55°C; Max Operating Temperature: 155°C; Packaging: Tape and Reel; Composition: Thick Film; Number of Terminations: 2; Features: Automotive AEC-Q200; Length: 0.126inch; Height: 0.028inch; Width: 0.063inch; Radiation Hardening: No; Lead Free: Lead Free; Stock 2: 152539; Pricing 2: 1=0.1, 10=0.084, 100=0.0324, 1000=0.01425, 2500=0.01231 (USD); Package Quantity: 1; ComponentLink1URL: http://www.produktinfo.conrad.com/datenblaetter/450000-474999/459488-da-01-en-WIDERSTAND_1206.pdf; ComponentLink1Description: http://www.produktinfo.conrad.com/datenblaetter/450000-474999/459488-da-01-en-WIDERSTAND_1206.pdf; ComponentLink2URL: http://www.produktinfo.conrad.com/datenblaetter/425000-449999/435433-da-01-en-SMD_WIDERST_1206_RC_3216_2R20_1__0_250W.pdf; ComponentLink2Description: http://www.produktinfo.conrad.com/datenblaetter/425000-449999/435433-da-01-en-SMD_WIDERST_1206_RC_3216_2R20_1__0_250W.pdf; Stock 3: 924652; Pricing 3: 1=0.16, 10=0.146, 100=0.0561, 1000=0.02467, 2500=0.0213 (USD); Voltage Rating: 200V; Termination: SMD/SMT; Military Standard: Not; Depth: 1.6mm; REACH SVHC: Unknown; ComponentLink3URL: http://documents.rs-components.com/techlib://itc_doclist_GB.htm?stockno=6179405; ComponentLink3Description: http://documents.rs-components.com/techlib://itc_doclist_GB.htm?stockno=6179405; ComponentLink4URL: http://www.yageo.com/documents/recent/PYu-RC_Group_51_RoHS_L_9.pdf; ComponentLink4Description: http://www.yageo.com/documents/recent/PYu-RC_Group_51_RoHS_L_9.pdf; ComponentLink5URL: http://www.farnell.com/datasheets/444357.pdf; ComponentLink5Description: http://www.farnell.com/datasheets/444357.pdf; ComponentLink6URL: http://www.yageo.com/documents/recent/PYu-RC1206_51_RoHS_L-4.pdf; ComponentLink6Description: http://www.yageo.com/documents/recent/PYu-RC1206_51_RoHS_L-4.pdf; ComponentLink7URL: http://www.yageo.com.tw/exep/pages/download/literatures/PYu-R_INT-thick_7.pdf; ComponentLink7Description: http://www.yageo.com.tw/exep/pages/download/literatures/PYu-R_INT-thick_7.pdf; .SCHCHK: USED; Supplier 1: Digi-Key; Supplier Part Number 1: 311-2.20FRCT-ND
footprint R-1206
pins: 1, 2

## R-2R49-2512
designator R?, comment 2R49  Max Power Dissipation: 2W  Case/Package: 2512
RES 2.49 OHM 1% 2W 2512; Manufacturer: Stackpole Electronics; Manufacturer Part Number: RHC2512FT2R49; Resistance: 2.49R; Temperature Coefficient: 100ppm/°C; Washability: OK; .Creator: M.OZKAN; .PCBCHK: USED; Supplier 1: Digi-Key; Stock 1: 22472; Pricing 1: 1 = 0.93000, 10 = 0.82400, 100 = 0.59770, 1000 = 0.35331 (USD); RoHS: Yes; Mount: Surface Mount; Case Code (Metric): 6432; Case Code (Imperial): 2512; Min Operating Temperature: -55°C; Max Operating Temperature: 155°C; Packaging: Tape and Reel; Composition: Thick Film; Number of Terminations: 2; Features: Moisture Resistant; Length: 0.248inch; Height: 0.028inch; Width: 0.126inch; Lead Free: Lead Free; ComponentLink1URL: https://www.seielect.com/catalog/SEI-Packaging.pdf?src-supplier=Digi-Key; ComponentLink1Description: https://www.seielect.com/catalog/SEI-Packaging.pdf?src-supplier=Digi-Key; Supplier Part Number 1: RHC2512FT2R49CT-ND; Tolerance: 1%; .SCHCHK: USED
pins: 1, 2